# Altium integrated library 15EDG.IntLib: 46 symbols
Pins are listed as number, name and electrical type; pins without a type are passive.

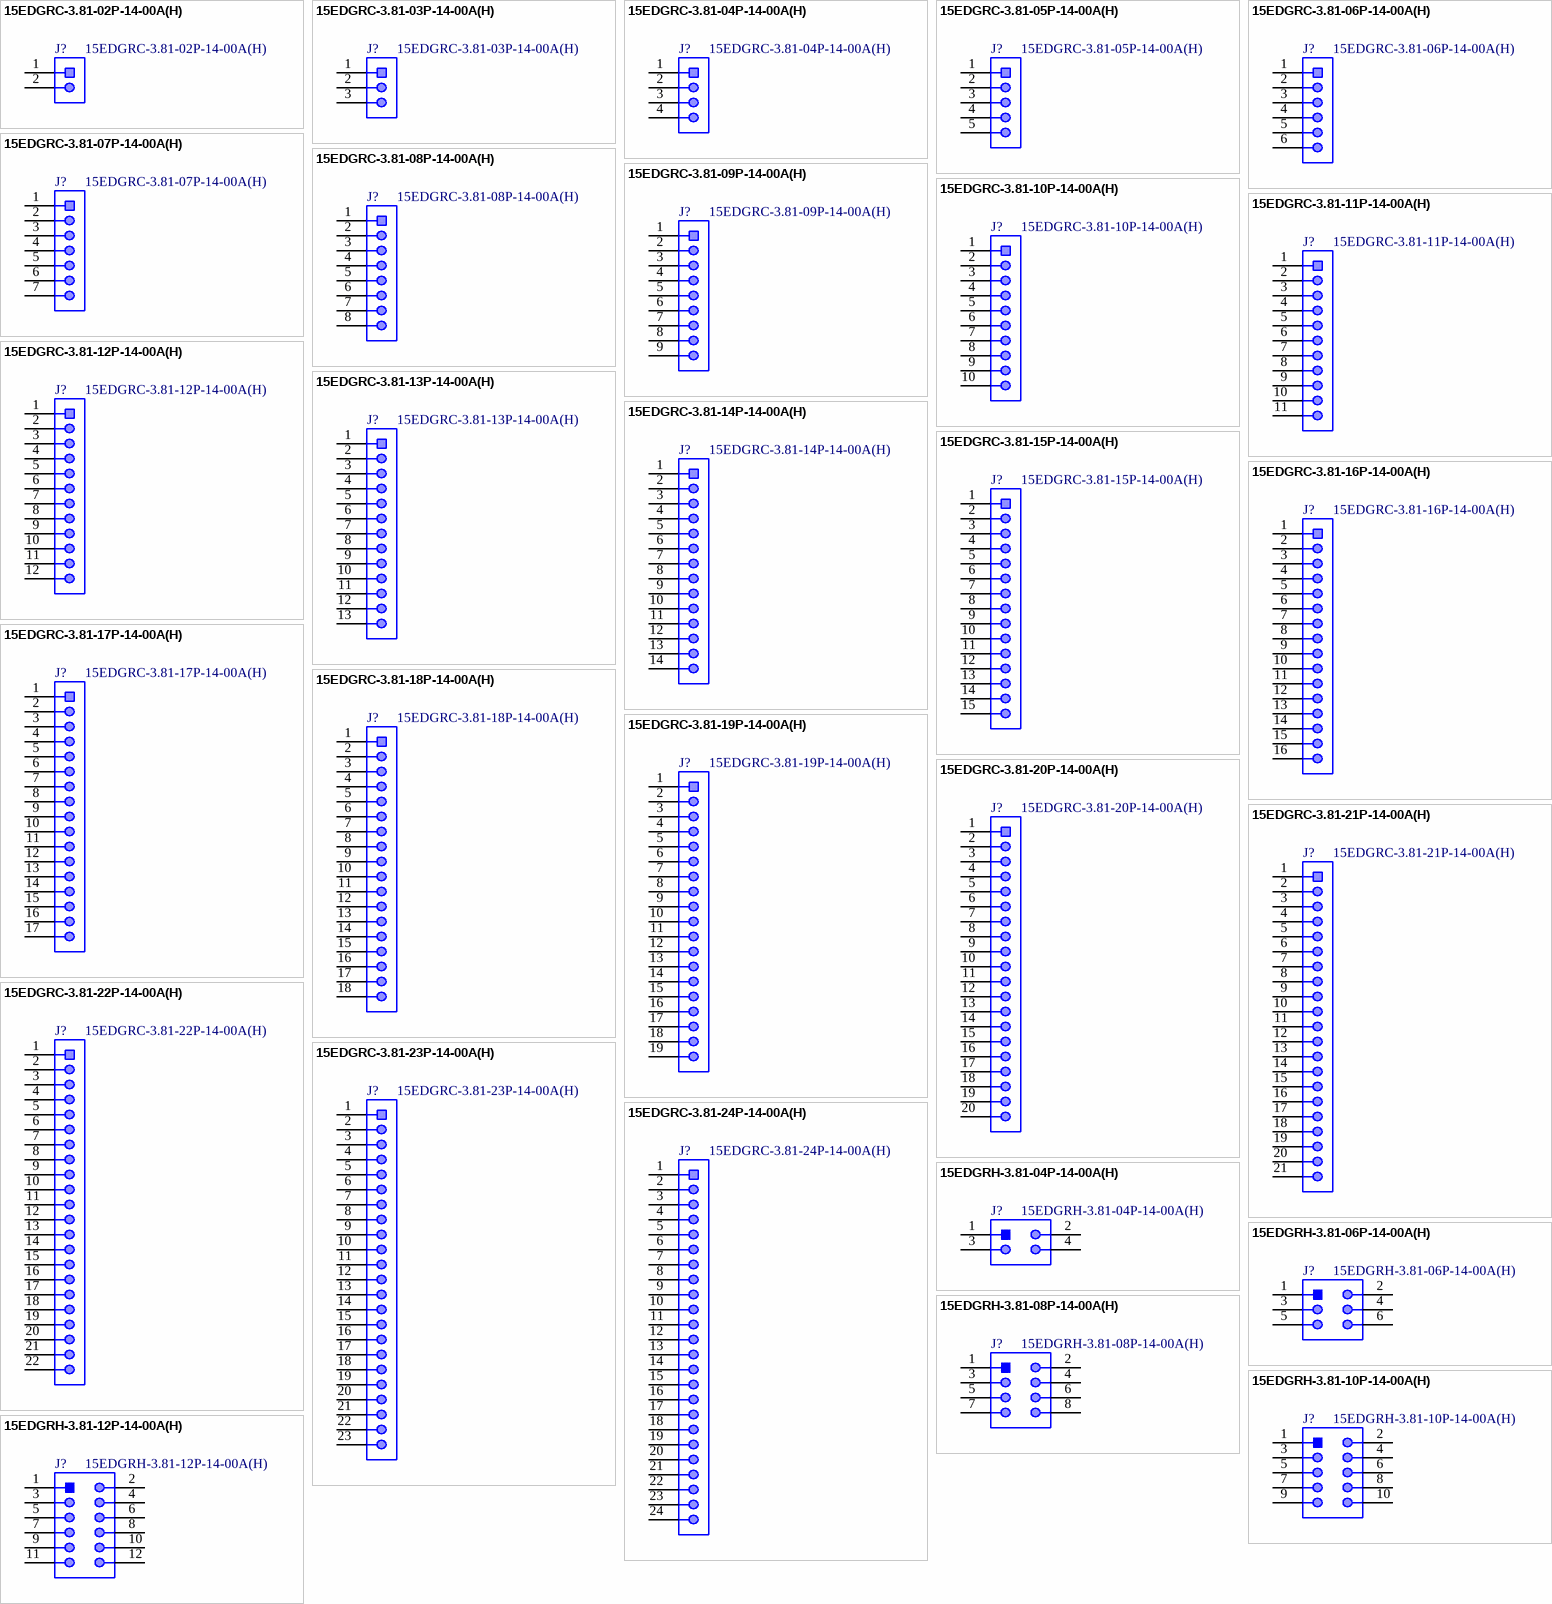
[diagram p0: symbols 15EDGRC-3.81-02P-14-00A(H) to 15EDGRH-3.81-12P-14-00A(H)]

## 15EDGRC-3.81-02P-14-00A(H)
designator J?
Pluggable Terminal Block, Horizontal, 1 x 2 Position, Pitch 3.81 mm, -40 to 105 degC, RoHS; Manufacturer: Degson Electronics; Poles: 2; Pitch: 3.81mm; Rated Current: 7A; Rated Voltage: 250V; No. of Rows: 1; Packing Unit: 200; Pin Arrangement: Single row in a straight line; Type of Installation: PCB welding; Pluggable or not: Yes; Process: Wave soldering/manual soldering; ComponentLink1Description: Manufacturer; ComponentLink1URL: http://www.degson.com/; ComponentLink2URL: https://www.degson.com.cn/index.php?a=downloadFile&id=833556&name=%27ZmlsZTQ=%27&lang=cn; ComponentLink2Description: Datasheet; Mounting Technology: Through Hole; Part Number: 15EDGRC-3.81-02P-14-00A(H); Operating Temperature: -40 to +105degC; Publisher: Bolgen Studio; Package Description: Terminal Block, Pitch 3.81 mm, 1 x 2 Position, Height 7.24 mm; Package Reference: 15EDGRC-3.81-02P-14-00A; Color: Green; Orientation: Horizontal; Datasheet Version: Rev. T1, 03/2020
footprint DGSN-15EDGRC-3.81-02P-14-00A_V (Terminal Block, 2-Pin, Body 8.41x9.2mm, Pitch 3.81mm)
pins: 1, 2

## 15EDGRC-3.81-03P-14-00A(H)
designator J?
Pluggable Terminal Block, Horizontal, 1 x 3 Position, Pitch 3.81 mm, -40 to 105 degC, RoHS; Manufacturer: Degson Electronics; Poles: 3; Pitch: 3.81mm; Rated Current: 7A; Rated Voltage: 250V; No. of Rows: 1; Packing Unit: 200; Pin Arrangement: Single row in a straight line; Type of Installation: PCB welding; Pluggable or not: Yes; Process: Wave soldering/manual soldering; ComponentLink1Description: Manufacturer; ComponentLink1URL: http://www.degson.com/; ComponentLink2URL: https://www.degson.com.cn/index.php?a=downloadFile&id=833556&name=%27ZmlsZTQ=%27&lang=cn; ComponentLink2Description: Datasheet; Mounting Technology: Through Hole; Part Number: 15EDGRC-3.81-03P-14-00A(H); Operating Temperature: -40 to +105degC; Publisher: Bolgen Studio; Package Description: Terminal Block, Pitch 3.81 mm, 1 x 3 Position, Height 7.24 mm; Package Reference: 15EDGRC-3.81-03P-14-00A; Color: Green; Orientation: Horizontal; Datasheet Version: Rev. T1, 03/2020
footprint DGSN-15EDGRC-3.81-03P-14-00A_V (Terminal Block, 3-Pin, Body 12.22x9.2mm, Pitch 3.81mm)
pins: 1, 2, 3

## 15EDGRC-3.81-04P-14-00A(H)
designator J?
Pluggable Terminal Block, Horizontal, 1 x 4 Position, Pitch 3.81 mm, -40 to 105 degC, RoHS; Manufacturer: Degson Electronics; Poles: 4; Pitch: 3.81mm; Rated Current: 7A; Rated Voltage: 250V; No. of Rows: 1; Packing Unit: 200; Pin Arrangement: Single row in a straight line; Type of Installation: PCB welding; Pluggable or not: Yes; Process: Wave soldering/manual soldering; ComponentLink1Description: Manufacturer; ComponentLink1URL: http://www.degson.com/; ComponentLink2URL: https://www.degson.com.cn/index.php?a=downloadFile&id=833556&name=%27ZmlsZTQ=%27&lang=cn; ComponentLink2Description: Datasheet; Mounting Technology: Through Hole; Part Number: 15EDGRC-3.81-04P-14-00A(H); Operating Temperature: -40 to +105degC; Publisher: Bolgen Studio; Package Description: Terminal Block, Pitch 3.81 mm, 1 x 4 Position, Height 7.24 mm; Package Reference: 15EDGRC-3.81-04P-14-00A; Color: Green; Orientation: Horizontal; Datasheet Version: Rev. T1, 03/2020
footprint DGSN-15EDGRC-3.81-04P-14-00A_V (Terminal Block, 4-Pin, Body 16.03x9.2mm, Pitch 3.81mm)
pins: 1, 2, 3, 4

## 15EDGRC-3.81-05P-14-00A(H)
designator J?
Pluggable Terminal Block, Horizontal, 1 x 5 Position, Pitch 3.81 mm, -40 to 105 degC, RoHS; Manufacturer: Degson Electronics; Poles: 5; Pitch: 3.81mm; Rated Current: 7A; Rated Voltage: 250V; No. of Rows: 1; Packing Unit: 200; Pin Arrangement: Single row in a straight line; Type of Installation: PCB welding; Pluggable or not: Yes; Process: Wave soldering/manual soldering; ComponentLink1Description: Manufacturer; ComponentLink1URL: http://www.degson.com/; ComponentLink2URL: https://www.degson.com.cn/index.php?a=downloadFile&id=833556&name=%27ZmlsZTQ=%27&lang=cn; ComponentLink2Description: Datasheet; Mounting Technology: Through Hole; Part Number: 15EDGRC-3.81-05P-14-00A(H); Operating Temperature: -40 to +105degC; Publisher: Bolgen Studio; Package Description: Terminal Block, Pitch 3.81 mm, 1 x 5 Position, Height 7.24 mm; Package Reference: 15EDGRC-3.81-05P-14-00A; Color: Green; Orientation: Horizontal; Datasheet Version: Rev. T1, 03/2020
footprint DGSN-15EDGRC-3.81-05P-14-00A_V (Terminal Block, 5-Pin, Body 19.84x9.2mm, Pitch 3.81mm)
pins: 1, 2, 3, 4, 5

## 15EDGRC-3.81-06P-14-00A(H)
designator J?
Pluggable Terminal Block, Horizontal, 1 x 6 Position, Pitch 3.81 mm, -40 to 105 degC, RoHS; Manufacturer: Degson Electronics; Poles: 6; Pitch: 3.81mm; Rated Current: 7A; Rated Voltage: 250V; No. of Rows: 1; Packing Unit: 200; Pin Arrangement: Single row in a straight line; Type of Installation: PCB welding; Pluggable or not: Yes; Process: Wave soldering/manual soldering; ComponentLink1Description: Manufacturer; ComponentLink1URL: http://www.degson.com/; ComponentLink2URL: https://www.degson.com.cn/index.php?a=downloadFile&id=833556&name=%27ZmlsZTQ=%27&lang=cn; ComponentLink2Description: Datasheet; Mounting Technology: Through Hole; Part Number: 15EDGRC-3.81-06P-14-00A(H); Operating Temperature: -40 to +105degC; Publisher: Bolgen Studio; Package Description: Terminal Block, Pitch 3.81 mm, 1 x 6 Position, Height 7.24 mm; Package Reference: 15EDGRC-3.81-06P-14-00A; Color: Green; Orientation: Horizontal; Datasheet Version: Rev. T1, 03/2020
footprint DGSN-15EDGRC-3.81-06P-14-00A_V (Terminal Block, 6-Pin, Body 23.65x9.2mm, Pitch 3.81mm)
pins: 1, 2, 3, 4, 5, 6

## 15EDGRC-3.81-07P-14-00A(H)
designator J?
Pluggable Terminal Block, Horizontal, 1 x 7 Position, Pitch 3.81 mm, -40 to 105 degC, RoHS; Manufacturer: Degson Electronics; Poles: 7; Pitch: 3.81mm; Rated Current: 7A; Rated Voltage: 250V; No. of Rows: 1; Packing Unit: 200; Pin Arrangement: Single row in a straight line; Type of Installation: PCB welding; Pluggable or not: Yes; Process: Wave soldering/manual soldering; ComponentLink1Description: Manufacturer; ComponentLink1URL: http://www.degson.com/; ComponentLink2URL: https://www.degson.com.cn/index.php?a=downloadFile&id=833556&name=%27ZmlsZTQ=%27&lang=cn; ComponentLink2Description: Datasheet; Mounting Technology: Through Hole; Part Number: 15EDGRC-3.81-07P-14-00A(H); Operating Temperature: -40 to +105degC; Publisher: Bolgen Studio; Package Description: Terminal Block, Pitch 3.81 mm, 1 x 7 Position, Height 7.24 mm; Package Reference: 15EDGRC-3.81-07P-14-00A; Color: Green; Orientation: Horizontal; Datasheet Version: Rev. T1, 03/2020
footprint DGSN-15EDGRC-3.81-07P-14-00A_V (Terminal Block, 7-Pin, Body 27.46x9.2mm, Pitch 3.81mm)
pins: 1, 2, 3, 4, 5, 6, 7

## 15EDGRC-3.81-08P-14-00A(H)
designator J?
Pluggable Terminal Block, Horizontal, 1 x 8 Position, Pitch 3.81 mm, -40 to 105 degC, RoHS; Manufacturer: Degson Electronics; Poles: 8; Pitch: 3.81mm; Rated Current: 7A; Rated Voltage: 250V; No. of Rows: 1; Packing Unit: 200; Pin Arrangement: Single row in a straight line; Type of Installation: PCB welding; Pluggable or not: Yes; Process: Wave soldering/manual soldering; ComponentLink1Description: Manufacturer; ComponentLink1URL: http://www.degson.com/; ComponentLink2URL: https://www.degson.com.cn/index.php?a=downloadFile&id=833556&name=%27ZmlsZTQ=%27&lang=cn; ComponentLink2Description: Datasheet; Mounting Technology: Through Hole; Part Number: 15EDGRC-3.81-08P-14-00A(H); Operating Temperature: -40 to +105degC; Publisher: Bolgen Studio; Package Description: Terminal Block, Pitch 3.81 mm, 1 x 8 Position, Height 7.24 mm; Package Reference: 15EDGRC-3.81-08P-14-00A; Color: Green; Orientation: Horizontal; Datasheet Version: Rev. T1, 03/2020
footprint DGSN-15EDGRC-3.81-08P-14-00A_V (Terminal Block, 8-Pin, Body 31.27x9.2mm, Pitch 3.81mm)
pins: 1, 2, 3, 4, 5, 6, 7, 8

## 15EDGRC-3.81-09P-14-00A(H)
designator J?
Pluggable Terminal Block, Horizontal, 1 x 9 Position, Pitch 3.81 mm, -40 to 105 degC, RoHS; Manufacturer: Degson Electronics; Poles: 9; Pitch: 3.81mm; Rated Current: 7A; Rated Voltage: 250V; No. of Rows: 1; Packing Unit: 200; Pin Arrangement: Single row in a straight line; Type of Installation: PCB welding; Pluggable or not: Yes; Process: Wave soldering/manual soldering; ComponentLink1Description: Manufacturer; ComponentLink1URL: http://www.degson.com/; ComponentLink2URL: https://www.degson.com.cn/index.php?a=downloadFile&id=833556&name=%27ZmlsZTQ=%27&lang=cn; ComponentLink2Description: Datasheet; Mounting Technology: Through Hole; Part Number: 15EDGRC-3.81-09P-14-00A(H); Operating Temperature: -40 to +105degC; Publisher: Bolgen Studio; Package Description: Terminal Block, Pitch 3.81 mm, 1 x 9 Position, Height 7.24 mm; Package Reference: 15EDGRC-3.81-09P-14-00A; Color: Green; Orientation: Horizontal; Datasheet Version: Rev. T1, 03/2020
footprint DGSN-15EDGRC-3.81-09P-14-00A_V (Terminal Block, 9-Pin, Body 35.08x9.2mm, Pitch 3.81mm)
pins: 1, 2, 3, 4, 5, 6, 7, 8, 9

## 15EDGRC-3.81-10P-14-00A(H)
designator J?
Pluggable Terminal Block, Horizontal, 1 x 10 Position, Pitch 3.81 mm, -40 to 105 degC, RoHS; Manufacturer: Degson Electronics; Poles: 10; Pitch: 3.81mm; Rated Current: 7A; Rated Voltage: 250V; No. of Rows: 1; Packing Unit: 200; Pin Arrangement: Single row in a straight line; Type of Installation: PCB welding; Pluggable or not: Yes; Process: Wave soldering/manual soldering; ComponentLink1Description: Manufacturer; ComponentLink1URL: http://www.degson.com/; ComponentLink2URL: https://www.degson.com.cn/index.php?a=downloadFile&id=833556&name=%27ZmlsZTQ=%27&lang=cn; ComponentLink2Description: Datasheet; Mounting Technology: Through Hole; Part Number: 15EDGRC-3.81-10P-14-00A(H); Operating Temperature: -40 to +105degC; Publisher: Bolgen Studio; Package Description: Terminal Block, Pitch 3.81 mm, 1 x 10 Position, Height 7.24 mm; Package Reference: 15EDGRC-3.81-10P-14-00A; Color: Green; Orientation: Horizontal; Datasheet Version: Rev. T1, 03/2020
footprint DGSN-15EDGRC-3.81-10P-14-00A_V (Terminal Block, 10-Pin, Body 38.89x9.2mm, Pitch 3.81mm)
pins: 1, 2, 3, 4, 5, 6, 7, 8, 9, 10

## 15EDGRC-3.81-11P-14-00A(H)
designator J?
Pluggable Terminal Block, Horizontal, 1 x 11 Position, Pitch 3.81 mm, -40 to 105 degC, RoHS; Manufacturer: Degson Electronics; Poles: 11; Pitch: 3.81mm; Rated Current: 7A; Rated Voltage: 250V; No. of Rows: 1; Packing Unit: 200; Pin Arrangement: Single row in a straight line; Type of Installation: PCB welding; Pluggable or not: Yes; Process: Wave soldering/manual soldering; ComponentLink1Description: Manufacturer; ComponentLink1URL: http://www.degson.com/; ComponentLink2URL: https://www.degson.com.cn/index.php?a=downloadFile&id=833556&name=%27ZmlsZTQ=%27&lang=cn; ComponentLink2Description: Datasheet; Mounting Technology: Through Hole; Part Number: 15EDGRC-3.81-11P-14-00A(H); Operating Temperature: -40 to +105degC; Publisher: Bolgen Studio; Package Description: Terminal Block, Pitch 3.81 mm, 1 x 11 Position, Height 7.24 mm; Package Reference: 15EDGRC-3.81-11P-14-00A; Color: Green; Orientation: Horizontal; Datasheet Version: Rev. T1, 03/2020
footprint DGSN-15EDGRC-3.81-11P-14-00A_V (Terminal Block, 11-Pin, Body 42.70x9.2mm, Pitch 3.81mm)
pins: 1, 2, 3, 4, 5, 6, 7, 8, 9, 10, 11

## 15EDGRC-3.81-12P-14-00A(H)
designator J?
Pluggable Terminal Block, Horizontal, 1 x 12 Position, Pitch 3.81 mm, -40 to 105 degC, RoHS; Manufacturer: Degson Electronics; Poles: 12; Pitch: 3.81mm; Rated Current: 7A; Rated Voltage: 250V; No. of Rows: 1; Packing Unit: 200; Pin Arrangement: Single row in a straight line; Type of Installation: PCB welding; Pluggable or not: Yes; Process: Wave soldering/manual soldering; ComponentLink1Description: Manufacturer; ComponentLink1URL: http://www.degson.com/; ComponentLink2URL: https://www.degson.com.cn/index.php?a=downloadFile&id=833556&name=%27ZmlsZTQ=%27&lang=cn; ComponentLink2Description: Datasheet; Mounting Technology: Through Hole; Part Number: 15EDGRC-3.81-12P-14-00A(H); Operating Temperature: -40 to +105degC; Publisher: Bolgen Studio; Package Description: Terminal Block, Pitch 3.81 mm, 1 x 12 Position, Height 7.24 mm; Package Reference: 15EDGRC-3.81-12P-14-00A; Color: Green; Orientation: Horizontal; Datasheet Version: Rev. T1, 03/2020
footprint DGSN-15EDGRC-3.81-12P-14-00A_V (Terminal Block, 12-Pin, Body 46.51x9.2mm, Pitch 3.81mm)
pins: 1, 2, 3, 4, 5, 6, 7, 8, 9, 10, 11, 12

## 15EDGRC-3.81-13P-14-00A(H)
designator J?
Pluggable Terminal Block, Horizontal, 1 x 13 Position, Pitch 3.81 mm, -40 to 105 degC, RoHS; Manufacturer: Degson Electronics; Poles: 13; Pitch: 3.81mm; Rated Current: 7A; Rated Voltage: 250V; No. of Rows: 1; Packing Unit: 200; Pin Arrangement: Single row in a straight line; Type of Installation: PCB welding; Pluggable or not: Yes; Process: Wave soldering/manual soldering; ComponentLink1Description: Manufacturer; ComponentLink1URL: http://www.degson.com/; ComponentLink2URL: https://www.degson.com.cn/index.php?a=downloadFile&id=833556&name=%27ZmlsZTQ=%27&lang=cn; ComponentLink2Description: Datasheet; Mounting Technology: Through Hole; Part Number: 15EDGRC-3.81-13P-14-00A(H); Operating Temperature: -40 to +105degC; Publisher: Bolgen Studio; Package Description: Terminal Block, Pitch 3.81 mm, 1 x 13 Position, Height 7.24 mm; Package Reference: 15EDGRC-3.81-13P-14-00A; Color: Green; Orientation: Horizontal; Datasheet Version: Rev. T1, 03/2020
footprint DGSN-15EDGRC-3.81-13P-14-00A_V (Terminal Block, 13-Pin, Body 50.32x9.2mm, Pitch 3.81mm)
pins: 1, 2, 3, 4, 5, 6, 7, 8, 9, 10, 11, 12, 13

## 15EDGRC-3.81-14P-14-00A(H)
designator J?
Pluggable Terminal Block, Horizontal, 1 x 14 Position, Pitch 3.81 mm, -40 to 105 degC, RoHS; Manufacturer: Degson Electronics; Poles: 14; Pitch: 3.81mm; Rated Current: 7A; Rated Voltage: 250V; No. of Rows: 1; Packing Unit: 200; Pin Arrangement: Single row in a straight line; Type of Installation: PCB welding; Pluggable or not: Yes; Process: Wave soldering/manual soldering; ComponentLink1Description: Manufacturer; ComponentLink1URL: http://www.degson.com/; ComponentLink2URL: https://www.degson.com.cn/index.php?a=downloadFile&id=833556&name=%27ZmlsZTQ=%27&lang=cn; ComponentLink2Description: Datasheet; Mounting Technology: Through Hole; Part Number: 15EDGRC-3.81-14P-14-00A(H); Operating Temperature: -40 to +105degC; Publisher: Bolgen Studio; Package Description: Terminal Block, Pitch 3.81 mm, 1 x 14 Position, Height 7.24 mm; Package Reference: 15EDGRC-3.81-14P-14-00A; Color: Green; Orientation: Horizontal; Datasheet Version: Rev. T1, 03/2020
footprint DGSN-15EDGRC-3.81-14P-14-00A_V (Terminal Block, 14-Pin, Body 54.13x9.2mm, Pitch 3.81mm)
pins: 1, 2, 3, 4, 5, 6, 7, 8, 9, 10, 11, 12, 13, 14

## 15EDGRC-3.81-15P-14-00A(H)
designator J?
Pluggable Terminal Block, Horizontal, 1 x 15 Position, Pitch 3.81 mm, -40 to 105 degC, RoHS; Manufacturer: Degson Electronics; Poles: 15; Pitch: 3.81mm; Rated Current: 7A; Rated Voltage: 250V; No. of Rows: 1; Packing Unit: 200; Pin Arrangement: Single row in a straight line; Type of Installation: PCB welding; Pluggable or not: Yes; Process: Wave soldering/manual soldering; ComponentLink1Description: Manufacturer; ComponentLink1URL: http://www.degson.com/; ComponentLink2URL: https://www.degson.com.cn/index.php?a=downloadFile&id=833556&name=%27ZmlsZTQ=%27&lang=cn; ComponentLink2Description: Datasheet; Mounting Technology: Through Hole; Part Number: 15EDGRC-3.81-15P-14-00A(H); Operating Temperature: -40 to +105degC; Publisher: Bolgen Studio; Package Description: Terminal Block, Pitch 3.81 mm, 1 x 15 Position, Height 7.24 mm; Package Reference: 15EDGRC-3.81-15P-14-00A; Color: Green; Orientation: Horizontal; Datasheet Version: Rev. T1, 03/2020
footprint DGSN-15EDGRC-3.81-15P-14-00A_V (Terminal Block, 15-Pin, Body 57.94x9.2mm, Pitch 3.81mm)
pins: 1, 2, 3, 4, 5, 6, 7, 8, 9, 10, 11, 12, 13, 14, 15

## 15EDGRC-3.81-16P-14-00A(H)
designator J?
Pluggable Terminal Block, Horizontal, 1 x 16 Position, Pitch 3.81 mm, -40 to 105 degC, RoHS; Manufacturer: Degson Electronics; Poles: 16; Pitch: 3.81mm; Rated Current: 7A; Rated Voltage: 250V; No. of Rows: 1; Packing Unit: 200; Pin Arrangement: Single row in a straight line; Type of Installation: PCB welding; Pluggable or not: Yes; Process: Wave soldering/manual soldering; ComponentLink1Description: Manufacturer; ComponentLink1URL: http://www.degson.com/; ComponentLink2URL: https://www.degson.com.cn/index.php?a=downloadFile&id=833556&name=%27ZmlsZTQ=%27&lang=cn; ComponentLink2Description: Datasheet; Mounting Technology: Through Hole; Part Number: 15EDGRC-3.81-16P-14-00A(H); Operating Temperature: -40 to +105degC; Publisher: Bolgen Studio; Package Description: Terminal Block, Pitch 3.81 mm, 1 x 16 Position, Height 7.24 mm; Package Reference: 15EDGRC-3.81-16P-14-00A; Color: Green; Orientation: Horizontal; Datasheet Version: Rev. T1, 03/2020
footprint DGSN-15EDGRC-3.81-16P-14-00A_V (Terminal Block, 16-Pin, Body 61.75x9.2mm, Pitch 3.81mm)
pins: 1, 2, 3, 4, 5, 6, 7, 8, 9, 10, 11, 12, 13, 14, 15, 16

## 15EDGRC-3.81-17P-14-00A(H)
designator J?
Pluggable Terminal Block, Horizontal, 1 x 17 Position, Pitch 3.81 mm, -40 to 105 degC, RoHS; Manufacturer: Degson Electronics; Poles: 17; Pitch: 3.81mm; Rated Current: 7A; Rated Voltage: 250V; No. of Rows: 1; Packing Unit: 200; Pin Arrangement: Single row in a straight line; Type of Installation: PCB welding; Pluggable or not: Yes; Process: Wave soldering/manual soldering; ComponentLink1Description: Manufacturer; ComponentLink1URL: http://www.degson.com/; ComponentLink2URL: https://www.degson.com.cn/index.php?a=downloadFile&id=833556&name=%27ZmlsZTQ=%27&lang=cn; ComponentLink2Description: Datasheet; Mounting Technology: Through Hole; Part Number: 15EDGRC-3.81-17P-14-00A(H); Operating Temperature: -40 to +105degC; Publisher: Bolgen Studio; Package Description: Terminal Block, Pitch 3.81 mm, 1 x 17 Position, Height 7.24 mm; Package Reference: 15EDGRC-3.81-17P-14-00A; Color: Green; Orientation: Horizontal; Datasheet Version: Rev. T1, 03/2020
footprint DGSN-15EDGRC-3.81-17P-14-00A_V (Terminal Block, 17-Pin, Body 65.56x9.2mm, Pitch 3.81mm)
pins: 1, 2, 3, 4, 5, 6, 7, 8, 9, 10, 11, 12, 13, 14, 15, 16, 17

## 15EDGRC-3.81-18P-14-00A(H)
designator J?
Pluggable Terminal Block, Horizontal, 1 x 18 Position, Pitch 3.81 mm, -40 to 105 degC, RoHS; Manufacturer: Degson Electronics; Poles: 18; Pitch: 3.81mm; Rated Current: 7A; Rated Voltage: 250V; No. of Rows: 1; Packing Unit: 200; Pin Arrangement: Single row in a straight line; Type of Installation: PCB welding; Pluggable or not: Yes; Process: Wave soldering/manual soldering; ComponentLink1Description: Manufacturer; ComponentLink1URL: http://www.degson.com/; ComponentLink2URL: https://www.degson.com.cn/index.php?a=downloadFile&id=833556&name=%27ZmlsZTQ=%27&lang=cn; ComponentLink2Description: Datasheet; Mounting Technology: Through Hole; Part Number: 15EDGRC-3.81-18P-14-00A(H); Operating Temperature: -40 to +105degC; Publisher: Bolgen Studio; Package Description: Terminal Block, Pitch 3.81 mm, 1 x 18 Position, Height 7.24 mm; Package Reference: 15EDGRC-3.81-18P-14-00A; Color: Green; Orientation: Horizontal; Datasheet Version: Rev. T1, 03/2020
footprint DGSN-15EDGRC-3.81-18P-14-00A_V (Terminal Block, 18-Pin, Body 69.37x9.2mm, Pitch 3.81mm)
pins: 1, 2, 3, 4, 5, 6, 7, 8, 9, 10, 11, 12, 13, 14, 15, 16, 17, 18

## 15EDGRC-3.81-19P-14-00A(H)
designator J?
Pluggable Terminal Block, Horizontal, 1 x 19 Position, Pitch 3.81 mm, -40 to 105 degC, RoHS; Manufacturer: Degson Electronics; Poles: 19; Pitch: 3.81mm; Rated Current: 7A; Rated Voltage: 250V; No. of Rows: 1; Packing Unit: 200; Pin Arrangement: Single row in a straight line; Type of Installation: PCB welding; Pluggable or not: Yes; Process: Wave soldering/manual soldering; ComponentLink1Description: Manufacturer; ComponentLink1URL: http://www.degson.com/; ComponentLink2URL: https://www.degson.com.cn/index.php?a=downloadFile&id=833556&name=%27ZmlsZTQ=%27&lang=cn; ComponentLink2Description: Datasheet; Mounting Technology: Through Hole; Part Number: 15EDGRC-3.81-19P-14-00A(H); Operating Temperature: -40 to +105degC; Publisher: Bolgen Studio; Package Description: Terminal Block, Pitch 3.81 mm, 1 x 19 Position, Height 7.24 mm; Package Reference: 15EDGRC-3.81-19P-14-00A; Color: Green; Orientation: Horizontal; Datasheet Version: Rev. T1, 03/2020
footprint DGSN-15EDGRC-3.81-19P-14-00A_V (Terminal Block, 19-Pin, Body 73.18x9.2mm, Pitch 3.81mm)
pins: 1, 2, 3, 4, 5, 6, 7, 8, 9, 10, 11, 12, 13, 14, 15, 16, 17, 18, 19

## 15EDGRC-3.81-20P-14-00A(H)
designator J?
Pluggable Terminal Block, Horizontal, 1 x 20 Position, Pitch 3.81 mm, -40 to 105 degC, RoHS; Manufacturer: Degson Electronics; Poles: 20; Pitch: 3.81mm; Rated Current: 7A; Rated Voltage: 250V; No. of Rows: 1; Packing Unit: 200; Pin Arrangement: Single row in a straight line; Type of Installation: PCB welding; Pluggable or not: Yes; Process: Wave soldering/manual soldering; ComponentLink1Description: Manufacturer; ComponentLink1URL: http://www.degson.com/; ComponentLink2URL: https://www.degson.com.cn/index.php?a=downloadFile&id=833556&name=%27ZmlsZTQ=%27&lang=cn; ComponentLink2Description: Datasheet; Mounting Technology: Through Hole; Part Number: 15EDGRC-3.81-20P-14-00A(H); Operating Temperature: -40 to +105degC; Publisher: Bolgen Studio; Package Description: Terminal Block, Pitch 3.81 mm, 1 x 20 Position, Height 7.24 mm; Package Reference: 15EDGRC-3.81-20P-14-00A; Color: Green; Orientation: Horizontal; Datasheet Version: Rev. T1, 03/2020
footprint DGSN-15EDGRC-3.81-20P-14-00A_V (Terminal Block, 20-Pin, Body 76.99x9.2mm, Pitch 3.81mm)
pins: 1, 2, 3, 4, 5, 6, 7, 8, 9, 10, 11, 12, 13, 14, 15, 16, 17, 18, 19, 20

## 15EDGRC-3.81-21P-14-00A(H)
designator J?
Pluggable Terminal Block, Horizontal, 1 x 21 Position, Pitch 3.81 mm, -40 to 105 degC, RoHS; Manufacturer: Degson Electronics; Poles: 21; Pitch: 3.81mm; Rated Current: 7A; Rated Voltage: 250V; No. of Rows: 1; Packing Unit: 200; Pin Arrangement: Single row in a straight line; Type of Installation: PCB welding; Pluggable or not: Yes; Process: Wave soldering/manual soldering; ComponentLink1Description: Manufacturer; ComponentLink1URL: http://www.degson.com/; ComponentLink2URL: https://www.degson.com.cn/index.php?a=downloadFile&id=833556&name=%27ZmlsZTQ=%27&lang=cn; ComponentLink2Description: Datasheet; Mounting Technology: Through Hole; Part Number: 15EDGRC-3.81-21P-14-00A(H); Operating Temperature: -40 to +105degC; Publisher: Bolgen Studio; Package Description: Terminal Block, Pitch 3.81 mm, 1 x 21 Position, Height 7.24 mm; Package Reference: 15EDGRC-3.81-21P-14-00A; Color: Green; Orientation: Horizontal; Datasheet Version: Rev. T1, 03/2020
footprint DGSN-15EDGRC-3.81-21P-14-00A_V (Terminal Block, 21-Pin, Body 80.80x9.2mm, Pitch 3.81mm)
pins: 1, 2, 3, 4, 5, 6, 7, 8, 9, 10, 11, 12, 13, 14, 15, 16, 17, 18, 19, 20, 21

## 15EDGRC-3.81-22P-14-00A(H)
designator J?
Pluggable Terminal Block, Horizontal, 1 x 22 Position, Pitch 3.81 mm, -40 to 105 degC, RoHS; Manufacturer: Degson Electronics; Poles: 22; Pitch: 3.81mm; Rated Current: 7A; Rated Voltage: 250V; No. of Rows: 1; Packing Unit: 200; Pin Arrangement: Single row in a straight line; Type of Installation: PCB welding; Pluggable or not: Yes; Process: Wave soldering/manual soldering; ComponentLink1Description: Manufacturer; ComponentLink1URL: http://www.degson.com/; ComponentLink2URL: https://www.degson.com.cn/index.php?a=downloadFile&id=833556&name=%27ZmlsZTQ=%27&lang=cn; ComponentLink2Description: Datasheet; Mounting Technology: Through Hole; Part Number: 15EDGRC-3.81-22P-14-00A(H); Operating Temperature: -40 to +105degC; Publisher: Bolgen Studio; Package Description: Terminal Block, Pitch 3.81 mm, 1 x 22 Position, Height 7.24 mm; Package Reference: 15EDGRC-3.81-22P-14-00A; Color: Green; Orientation: Horizontal; Datasheet Version: Rev. T1, 03/2020
footprint DGSN-15EDGRC-3.81-22P-14-00A_V (Terminal Block, 22-Pin, Body 84.61x9.2mm, Pitch 3.81mm)
pins: 1, 2, 3, 4, 5, 6, 7, 8, 9, 10, 11, 12, 13, 14, 15, 16, 17, 18, 19, 20, 21, 22

## 15EDGRC-3.81-23P-14-00A(H)
designator J?
Pluggable Terminal Block, Horizontal, 1 x 23 Position, Pitch 3.81 mm, -40 to 105 degC, RoHS; Manufacturer: Degson Electronics; Poles: 23; Pitch: 3.81mm; Rated Current: 7A; Rated Voltage: 250V; No. of Rows: 1; Packing Unit: 200; Pin Arrangement: Single row in a straight line; Type of Installation: PCB welding; Pluggable or not: Yes; Process: Wave soldering/manual soldering; ComponentLink1Description: Manufacturer; ComponentLink1URL: http://www.degson.com/; ComponentLink2URL: https://www.degson.com.cn/index.php?a=downloadFile&id=833556&name=%27ZmlsZTQ=%27&lang=cn; ComponentLink2Description: Datasheet; Mounting Technology: Through Hole; Part Number: 15EDGRC-3.81-23P-14-00A(H); Operating Temperature: -40 to +105degC; Publisher: Bolgen Studio; Package Description: Terminal Block, Pitch 3.81 mm, 1 x 23 Position, Height 7.24 mm; Package Reference: 15EDGRC-3.81-23P-14-00A; Color: Green; Orientation: Horizontal; Datasheet Version: Rev. T1, 03/2020
footprint DGSN-15EDGRC-3.81-23P-14-00A_V (Terminal Block, 23-Pin, Body 88.42x9.2mm, Pitch 3.81mm)
pins: 1, 2, 3, 4, 5, 6, 7, 8, 9, 10, 11, 12, 13, 14, 15, 16, 17, 18, 19, 20, 21, 22, 23
